# Altium footprint library ICs And Semiconductors SMD.PcbLib: 602 footprints (part 34 of 38)
Each footprint in its own frame and in the unit in brackets; x right, y up, seen from the top. Pads: shape width x height; smd on the part's side, far side on the other; paste and mask are expansions set on the pad; w line width, h text height; cw(c..) or ccw(c..) is an arc to the next point about the centre after c.
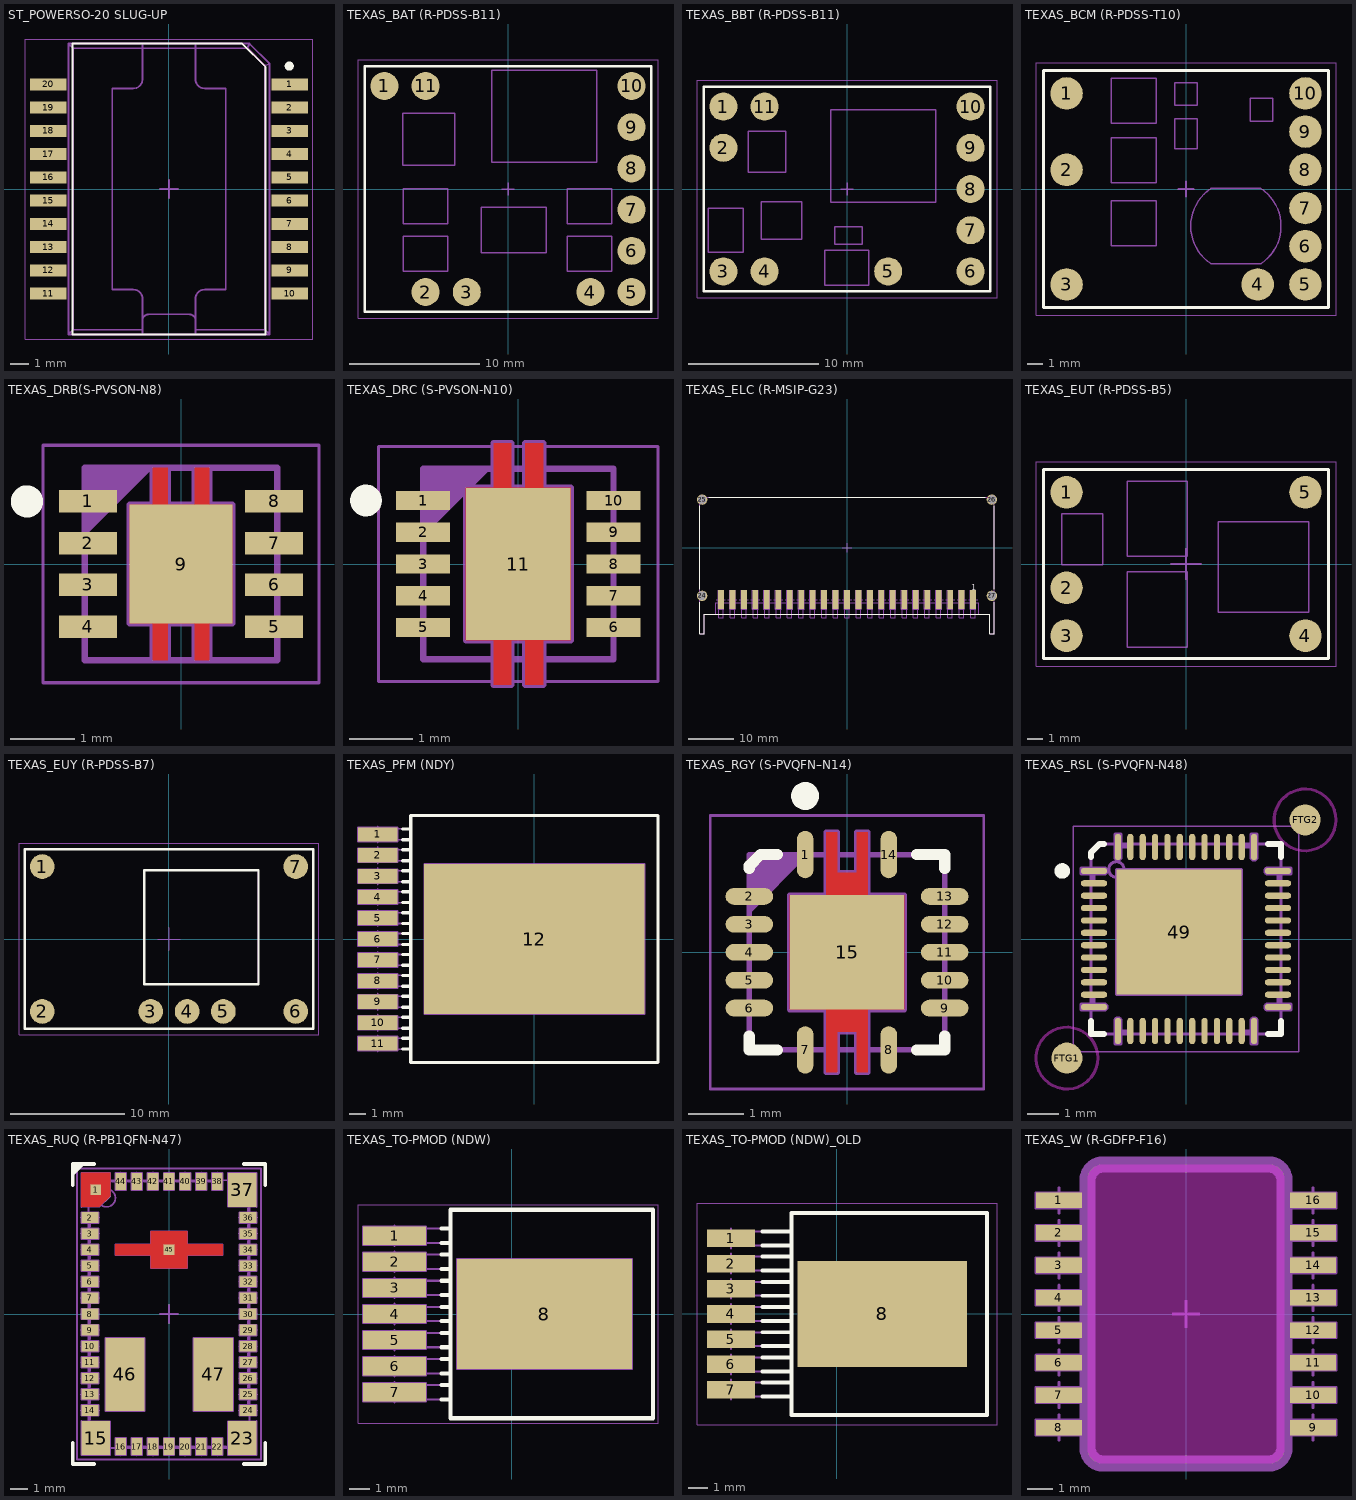
[diagram p33: the footprints below, top view; thin cyan lines are the x and y axes]

## ST_POWERSO-20 SLUG-UP [mm] "SOIC, 1.27mm Pitch; 20 Pin, 11.00mm W X 15.70mm L X 3.50mm H body (w/Thermal Tab on Top Side"
height 3.5
pads (20):
  rect 2x0.65 smd: 1(6.6,5.715) 2(6.6,4.445) 3(6.6,3.175) 4(6.6,1.905) 5(6.6,0.635) 6(6.6,-0.635) 7(6.6,-1.905) 8(6.6,-3.175) 9(6.6,-4.445) 10(6.6,-5.715) 11(-6.6,-5.715) 12(-6.6,-4.445) 13(-6.6,-3.175) 14(-6.6,-1.905) 15(-6.6,-0.635) 16(-6.6,0.635) 17(-6.6,1.905) 18(-6.6,3.175) 19(-6.6,4.445) 20(-6.6,5.715)
Top Overlay:
  circle w0.25: c6.575,6.72 r0.125
  lines w0.1: -5.275,-7.95 -5.275,7.95 4.003,7.95 5.275,6.678 5.275,-7.95 -5.275,-7.95
Mechanical 8:
  lines w0.1: -0.5,0 0,0 ; 0,-0.5 0,0 ; 0,0.5 0,0 ; 0.5,0 0,0
Mechanical 14:
  lines w0.1: -1.45,-7.95 -1.45,-6 ccw(c-1.95,-6) -1.95,-5.5 -3.1,-5.5 -3.1,5.5 -1.95,5.5 ccw(c-1.95,6) -1.45,6 -1.45,7.95 ; -1.45,-7.696 -5.246,-7.696 ; -1.45,-7.2 cw(c-1.1,-7.2) -1.1,-6.85 1.1,-6.85 cw(c1.1,-7.2) 1.45,-7.2 ; 1.45,-7.95 1.45,-6 cw(c1.95,-6) 1.95,-5.5 3.1,-5.5 3.1,5.5 1.95,5.5 cw(c1.95,6) 1.45,6 1.45,7.95 ; 1.45,-7.696 5.246,-7.696 ; -5.5,-7.95 -5.246,-7.696 ; -5.5,-7.95 5.5,-7.95 ; -5.5,-7.95 -5.5,7.95 ; -5.5,7.95 -5.246,7.696 ; -5.5,7.95 4.4,7.95 ; -5.246,-7.696 -5.246,7.696 ; -5.246,7.696 4.295,7.696 ; 4.295,7.696 5.246,6.745 ; 4.295,7.696 4.4,7.95 ; 4.4,7.95 5.5,6.85 ; 5.246,-7.696 5.5,-7.95 ; 5.246,-7.696 5.246,6.745 ; 5.246,6.745 5.5,6.85 ; 5.5,-7.95 5.5,6.85
Mechanical 15:
  lines w0.05: -7.85,-8.2 7.85,-8.2 7.85,8.2 -7.85,8.2 -7.85,-8.2
3D body "ST_POWERSO-20 SLUG-UP.stp": height 3.5, standoff 0, extent -7.1,-7.95 7.1,7.95

## TEXAS_BAT (R-PDSS-B11) [mm] "TEXAS BAT (R-PDSS-B11) Case"
height 8.5
pads (11):
  round 2.16 smd: 1(-9.525,7.938) 2(-6.35,-7.938) 3(-3.175,-7.938) 4(6.35,-7.938) 5(9.525,-7.938) 6(9.525,-4.763) 7(9.525,-1.587) 8(9.525,1.587) 9(9.525,4.763) 10(9.525,7.938) 11(-6.35,7.938)
Top Overlay:
  lines w0.2: -11.049,-9.462 11.049,-9.462 11.049,9.462 -11.049,9.462 -11.049,-9.462
Mechanical 8:
  lines w0.1: -10.025,7.938 -9.525,7.938 ; -9.525,7.438 -9.525,7.938 ; -9.525,8.438 -9.525,7.938 ; -9.025,7.938 -9.525,7.938 ; -6.85,-7.938 -6.35,-7.938 ; -6.85,7.938 -6.35,7.938 ; -6.35,-8.438 -6.35,-7.938 ; -6.35,-7.438 -6.35,-7.938 ; -6.35,7.438 -6.35,7.938 ; -6.35,8.438 -6.35,7.938 ; -5.85,-7.938 -6.35,-7.938 ; -5.85,7.938 -6.35,7.938 ; -3.675,-7.938 -3.175,-7.938 ; -3.175,-8.438 -3.175,-7.938 ; -3.175,-7.438 -3.175,-7.938 ; -2.675,-7.938 -3.175,-7.938 ; -0.5,0 0,0 ; 0,-0.5 0,0 ; 0,0.5 0,0 ; 0.5,0 0,0 ; 5.85,-7.938 6.35,-7.938 ; 6.35,-8.438 6.35,-7.938 ; 6.35,-7.438 6.35,-7.938 ; 6.85,-7.938 6.35,-7.938 ; 9.025,-7.938 9.525,-7.938 ; 9.025,-4.763 9.525,-4.763 ; 9.025,-1.587 9.525,-1.587 ; 9.025,1.587 9.525,1.587 ; 9.025,4.763 9.525,4.763 ; 9.025,7.938 9.525,7.938 ; 9.525,-8.438 9.525,-7.938 ; 9.525,-7.438 9.525,-7.938 ; 9.525,-5.263 9.525,-4.763 ; 9.525,-4.263 9.525,-4.763 ; 9.525,-2.088 9.525,-1.587 ; 9.525,-1.088 9.525,-1.587 ; 9.525,1.088 9.525,1.587 ; 9.525,2.088 9.525,1.587 ; 9.525,4.263 9.525,4.763 ; 9.525,5.263 9.525,4.763 ; 9.525,7.438 9.525,7.938 ; 9.525,8.438 9.525,7.938 ; 10.025,-7.938 9.525,-7.938 ; 10.025,-4.763 9.525,-4.763 ; 10.025,-1.587 9.525,-1.587 ; 10.025,1.587 9.525,1.587 ; 10.025,4.763 9.525,4.763 ; 10.025,7.938 9.525,7.938
Mechanical 14:
  lines w0.1: -11.049,-9.462 -11.049,9.462 11.049,9.462 11.049,-9.462 -11.049,-9.462 ; -8.122,1.829 -8.122,5.829 -4.122,5.829 -4.122,1.829 -8.122,1.829 ; -8.054,-6.337 -8.054,-3.637 -4.654,-3.637 -4.654,-6.337 -8.054,-6.337 ; -8.054,-2.671 -8.054,0.029 -4.654,0.029 -4.654,-2.671 -8.054,-2.671 ; -2.059,-4.897 2.941,-4.897 2.941,-1.397 -2.059,-1.397 -2.059,-4.897 ; -1.251,2.062 -1.251,9.162 6.849,9.162 6.849,2.062 -1.251,2.062 ; 4.584,-6.337 4.584,-3.637 7.984,-3.637 7.984,-6.337 4.584,-6.337 ; 4.584,-2.671 4.584,0.029 7.984,0.029 7.984,-2.671 4.584,-2.671
Mechanical 15:
  lines w0.05: -11.557,-9.97 -11.557,9.97 11.557,9.97 11.557,-9.97 -11.557,-9.97
3D body "TEXAS_BAT (R-PDSS-B11).stp": height 9.09, standoff 0, extent -11.049,-9.461 11.049,9.462

## TEXAS_BBT (R-PDSS-B11) [mm] "TEXAS BBT (R-PDSS-B11) Case"
height 8.5
pads (11):
  round 2.16 smd: 1(-9.525,6.35) 2(-9.525,3.175) 3(-9.525,-6.35) 4(-6.35,-6.35) 5(3.175,-6.35) 6(9.525,-6.35) 7(9.525,-3.175) 8(9.525,0) 9(9.525,3.175) 10(9.525,6.35) 11(-6.35,6.35)
Top Overlay:
  lines w0.2: -11.049,-7.874 11.049,-7.874 11.049,7.874 -11.049,7.874 -11.049,-7.874
Mechanical 8:
  lines w0.1: -10.025,-6.35 -9.525,-6.35 ; -10.025,3.175 -9.525,3.175 ; -10.025,6.35 -9.525,6.35 ; -9.525,-6.85 -9.525,-6.35 ; -9.525,-5.85 -9.525,-6.35 ; -9.525,2.675 -9.525,3.175 ; -9.525,3.675 -9.525,3.175 ; -9.525,5.85 -9.525,6.35 ; -9.525,6.85 -9.525,6.35 ; -9.025,-6.35 -9.525,-6.35 ; -9.025,3.175 -9.525,3.175 ; -9.025,6.35 -9.525,6.35 ; -6.85,-6.35 -6.35,-6.35 ; -6.85,6.35 -6.35,6.35 ; -6.35,-6.85 -6.35,-6.35 ; -6.35,-5.85 -6.35,-6.35 ; -6.35,5.85 -6.35,6.35 ; -6.35,6.85 -6.35,6.35 ; -5.85,-6.35 -6.35,-6.35 ; -5.85,6.35 -6.35,6.35 ; -0.5,0 0,0 ; 0,-0.5 0,0 ; 0,0.5 0,0 ; 0.5,0 0,0 ; 2.675,-6.35 3.175,-6.35 ; 3.175,-6.85 3.175,-6.35 ; 3.175,-5.85 3.175,-6.35 ; 3.675,-6.35 3.175,-6.35 ; 9.025,-3.175 9.525,-3.175 ; 9.025,0 9.525,0 ; 9.025,3.175 9.525,3.175 ; 9.025,6.35 9.525,6.35 ; 9.525,-3.675 9.525,-3.175 ; 9.525,-2.675 9.525,-3.175 ; 9.525,-0.5 9.525,0 ; 9.525,0.5 9.525,0 ; 9.525,2.675 9.525,3.175 ; 9.525,3.675 9.525,3.175 ; 9.525,5.85 9.525,6.35 ; 9.525,6.85 9.525,6.35 ; 10.025,-3.175 9.525,-3.175 ; 10.025,0 9.525,0 ; 10.025,3.175 9.525,3.175 ; 10.025,6.35 9.525,6.35 ; 9.525,-6.35 9.025,-6.35 9.525,-6.35 ; 9.525,-6.35 9.525,-6.85 9.525,-6.35 ; 9.525,-6.35 10.025,-6.35 9.525,-6.35 ; 9.525,-6.35 9.525,-5.85 9.525,-6.35
Mechanical 14:
  lines w0.1: -11.049,-7.874 -11.049,7.874 11.049,7.874 11.049,-7.874 -11.049,-7.874 ; -10.681,-4.876 -10.681,-1.476 -7.981,-1.476 -7.981,-4.876 -10.681,-4.876 ; -7.601,1.286 -7.601,4.436 -4.701,4.436 -4.701,1.286 -7.601,1.286 ; -6.625,-3.872 -6.625,-0.972 -3.475,-0.972 -3.475,-3.872 -6.625,-3.872 ; -1.721,-7.416 -1.721,-4.716 1.679,-4.716 1.679,-7.416 -1.721,-7.416 ; -1.251,-1.005 -1.251,6.095 6.849,6.095 6.849,-1.005 -1.251,-1.005 ; -0.929,-4.272 -0.929,-2.922 1.171,-2.922 1.171,-4.272 -0.929,-4.272
Mechanical 15:
  lines w0.05: -11.557,-8.382 -11.557,8.382 11.557,8.382 11.557,-8.382 -11.557,-8.382
3D body "TEXAS_BBT (R-PDSS-B11).stp": height 9.09, standoff 0, extent -11.049,-7.874 11.049,7.874

## TEXAS_BCM (R-PDSS-T10) [mm] "TEXAS BCM (R-PDSS-T10)  Case"
height 8.5
pads (10):
  round 2.16 smd: 1(-7.935,6.355) 2(-7.935,1.275) 3(-7.935,-6.345) 4(4.765,-6.345) 5(7.935,-6.345) 6(7.935,-3.805) 7(7.935,-1.265) 8(7.935,1.275) 9(7.935,3.815) 10(7.935,6.355)
Top Overlay:
  lines w0.2: -9.46,-7.875 -9.46,7.875 9.46,7.875 9.46,-7.875 -9.46,-7.875
Mechanical 8:
  lines w0.1: -8.435,-6.345 -7.935,-6.345 ; -8.435,1.275 -7.935,1.275 ; -8.435,6.355 -7.935,6.355 ; -7.935,-6.845 -7.935,-6.345 ; -7.935,-5.845 -7.935,-6.345 ; -7.935,0.775 -7.935,1.275 ; -7.935,1.775 -7.935,1.275 ; -7.935,5.855 -7.935,6.355 ; -7.935,6.855 -7.935,6.355 ; -7.435,-6.345 -7.935,-6.345 ; -7.435,1.275 -7.935,1.275 ; -7.435,6.355 -7.935,6.355 ; -0.5,0 0,0 ; 0,-0.5 0,0 ; 0,0.5 0,0 ; 0.5,0 0,0 ; 4.265,-6.345 4.765,-6.345 ; 4.765,-6.845 4.765,-6.345 ; 4.765,-5.845 4.765,-6.345 ; 5.265,-6.345 4.765,-6.345 ; 7.435,-6.345 7.935,-6.345 ; 7.435,-3.805 7.935,-3.805 ; 7.435,-1.265 7.935,-1.265 ; 7.435,1.275 7.935,1.275 ; 7.435,3.815 7.935,3.815 ; 7.435,6.355 7.935,6.355 ; 7.935,-6.845 7.935,-6.345 ; 7.935,-5.845 7.935,-6.345 ; 7.935,-4.305 7.935,-3.805 ; 7.935,-3.305 7.935,-3.805 ; 7.935,-1.765 7.935,-1.265 ; 7.935,-0.765 7.935,-1.265 ; 7.935,0.775 7.935,1.275 ; 7.935,1.775 7.935,1.275 ; 7.935,3.315 7.935,3.815 ; 7.935,4.315 7.935,3.815 ; 7.935,5.855 7.935,6.355 ; 7.935,6.855 7.935,6.355 ; 8.435,-6.345 7.935,-6.345 ; 8.435,-3.805 7.935,-3.805 ; 8.435,-1.265 7.935,-1.265 ; 8.435,1.275 7.935,1.275 ; 8.435,3.815 7.935,3.815 ; 8.435,6.355 7.935,6.355
Mechanical 14:
  lines w0.1: -9.46,-7.875 9.46,-7.875 9.46,7.875 -9.46,7.875 -9.46,-7.875 ; -4.963,-3.774 -1.963,-3.774 -1.963,-0.774 -4.963,-0.774 -4.963,-3.774 ; -4.963,0.422 -1.963,0.422 -1.963,3.422 -4.963,3.422 -4.963,0.422 ; -4.963,4.361 -1.963,4.361 -1.963,7.361 -4.963,7.361 -4.963,4.361 ; -0.75,2.683 0.75,2.683 0.75,4.683 -0.75,4.683 -0.75,2.683 ; -0.75,5.572 0.75,5.572 0.75,7.072 -0.75,7.072 -0.75,5.572 ; 1.656,-4.966 cw(c3.314,-2.466) 1.656,0.034 4.972,0.034 cw(c3.314,-2.466) 4.972,-4.966 1.656,-4.966 ; 4.255,4.516 5.755,4.516 5.755,6.016 4.255,6.016 4.255,4.516
Mechanical 15:
  lines w0.05: -9.97,-8.38 -9.97,8.38 9.97,8.38 9.97,-8.38 -9.97,-8.38
3D body "TEXAS_BCM (R-PDSS-T10).stp": height 8.5, standoff 0, extent -9.46,-7.875 9.46,7.875

## TEXAS_DRB(S-PVSON-N8) [mm] "TEXAS Case Style DRB(S-PVSON-N8), SON, 0.65mm pitch, 8 pin, 3mm X 3mm X 1.00mm H body (w/thermal tab 1.60 X 1.85mm)"
height 1
pads (9):
  rect 0.9x0.35 smd: 1(-1.45,0.975) 2(-1.45,0.325) 3(-1.45,-0.325) 4(-1.45,-0.975) 5(1.45,-0.975) 6(1.45,-0.325) 7(1.45,0.325) 8(1.45,0.975)
  rect 1.6x1.85 smd: 9(0,0)
Top Layer:
  region: -0.44,-1.5 -0.44,-0.925 -0.8,-0.925 -0.8,0.925 -0.44,0.925 -0.44,1.5 -0.21,1.5 -0.21,0.925 0.21,0.925 0.21,1.5 0.44,1.5 0.44,0.925 0.8,0.925 0.8,-0.925 0.44,-0.925 0.44,-1.5 0.21,-1.5 0.21,-0.925 -0.21,-0.925 -0.21,-1.5
Top Overlay:
  circle w0.25: c-2.4,0.975 r0.125
Mechanical 8:
  lines w0.1: -0.8,-0.925 -0.8,0.925 -0.44,0.925 -0.44,1.5 -0.21,1.5 -0.21,0.925 0.21,0.925 0.21,1.5 0.44,1.5 0.44,0.925 0.8,0.925 0.8,-0.925 0.44,-0.925 0.44,-1.5 0.21,-1.5 0.21,-0.925 -0.21,-0.925 -0.21,-1.5 -0.44,-1.5 -0.44,-0.925 -0.8,-0.925
Mechanical 14:
  lines w0.1: -1.5,0.5 -0.5,1.5 ; -1.5,0.6 -0.6,1.5 ; -1.5,0.7 -0.7,1.5 ; -1.5,0.8 -0.8,1.5 ; -1.5,0.9 -0.9,1.5 ; -1.5,1 -1,1.5 ; -1.5,1.1 -1.1,1.5 ; -1.5,1.2 -1.2,1.5 ; -1.5,1.3 -1.3,1.5 ; -1.5,1.4 -1.4,1.5 ; -1.5,-1.5 -1.5,1.5 1.5,1.5 1.5,-1.5 -1.5,-1.5
Mechanical 15:
  circle w0.05: c0,0 r0.35
  lines w0.05: -0.5,0 0.5,0 ; 0,-0.5 0,0.5 ; -2.15,-1.85 2.15,-1.85 2.15,1.85 -2.15,1.85 -2.15,-1.85
3D body "SON65P300X300X100-9N-R160X185.stp": height 1, standoff 0, extent -1.5,-1.5 1.5,1.5

## TEXAS_DRC (S-PVSON-N10) [mm] "SON, TEXAS DRC (S-PVSON-N10), 0.50mm Pitch, 10-pin, 3.00mm W  X 3.00mm L X 1.00mm Height, (w/thermal tab 1.65 X 2.40 mm)"
height 1
pads (11):
  rect 0.85x0.3 smd: 1(-1.5,1) 2(-1.5,0.5) 3(-1.5,0) 4(-1.5,-0.5) 5(-1.5,-1) 6(1.5,-1) 7(1.5,-0.5) 8(1.5,0) 9(1.5,0.5) 10(1.5,1)
  rect 1.65x2.4 smd: 11(0,0)
Top Layer:
  region: -0.825,1.2 -0.39,1.2 -0.39,1.9 -0.11,1.9 -0.11,1.2 0.11,1.2 0.11,1.9 0.39,1.9 0.39,1.2 0.825,1.2 0.825,-1.2 0.39,-1.2 0.39,-1.9 0.11,-1.9 0.11,-1.2 -0.11,-1.2 -0.11,-1.9 -0.39,-1.9 -0.39,-1.2 -0.825,-1.2
Top Overlay:
  circle w0.25: c-2.4,1 r0.125
Mechanical 8:
  lines w0.1: -0.5,0 0,0 ; 0,-0.5 0,0 ; 0,0.5 0,0 ; 0.5,0 0,0 ; -0.825,-1.2 -0.39,-1.2 -0.39,-1.9 -0.11,-1.9 -0.11,-1.2 0.11,-1.2 0.11,-1.9 0.39,-1.9 0.39,-1.2 0.825,-1.2 0.825,1.2 0.39,1.2 0.39,1.9 0.11,1.9 0.11,1.2 -0.11,1.2 -0.11,1.9 -0.39,1.9 -0.39,1.2 -0.825,1.2 -0.825,-1.2
Mechanical 14:
  lines w0.1: -1.5,0.5 -0.5,1.5 ; -1.5,0.6 -0.6,1.5 ; -1.5,0.7 -0.7,1.5 ; -1.5,0.8 -0.8,1.5 ; -1.5,0.9 -0.9,1.5 ; -1.5,1 -1,1.5 ; -1.5,1.1 -1.1,1.5 ; -1.5,1.2 -1.2,1.5 ; -1.5,1.3 -1.3,1.5 ; -1.5,1.4 -1.4,1.5 ; -1.5,-1.5 -1.5,1.5 1.5,1.5 1.5,-1.5 -1.5,-1.5
Mechanical 15:
  lines w0.05: -0.5,0 0.5,0 ; 0,-0.5 0,0.5 ; -2.2,-1.85 2.2,-1.85 2.2,1.85 -2.2,1.85 -2.2,-1.85
3D body "TEXAS_DRC (S-PVSON-N10).stp": height 1, standoff 0, extent -1.575,-1.575 1.575,1.575

## TEXAS_ELC (R-MSIP-G23) [mm] "TEXAS ELC (R-MSIP-G23) Case"
height 12.7
pads (27):
  rect 1.27x4.19 smd: 1(27.941,-11.509) 2(25.401,-11.509) 3(22.861,-11.509) 4(20.321,-11.509) 5(17.781,-11.509) 6(15.241,-11.509) 7(12.701,-11.509) 8(10.161,-11.509) 9(7.621,-11.509) 10(5.081,-11.509) 11(2.541,-11.509) 12(0.001,-11.509) 13(-2.539,-11.509) 14(-5.079,-11.509) 15(-7.619,-11.509) 16(-10.159,-11.509) 17(-12.699,-11.509) 18(-15.239,-11.509) 19(-17.779,-11.509) 20(-20.319,-11.509) 21(-22.859,-11.509) 22(-25.399,-11.509) 23(-27.939,-11.509)
  round 2.3 hole 1.8: 24(-32.105,-10.665) 25(-32.105,10.665) 26(32.105,10.665) 27(32.105,-10.665)
Top Overlay:
  lines w0.2: -32.605,-12.079 -32.605,-19.055 -31.605,-19.055 -31.605,-14.735 31.605,-14.735 31.605,-19.055 32.605,-19.055 32.605,-12.079 ; -32.605,-9.251 -32.605,9.251 ; -30.691,11.165 30.691,11.165 ; 32.605,-9.251 32.605,9.251
  text "1" at 27.559,-9.398 h1.27
Mechanical 8:
  drawing of 204 lines, arcs and shapes, not listed
Mechanical 14:
  lines w0.1: -29.105,-14.735 -29.105,-12.235 29.105,-12.235 29.105,-14.735 ; -28.44,-14.735 -31.605,-14.735 -31.605,-19.055 -32.605,-19.055 -32.605,11.165 32.605,11.165 32.605,-19.055 31.605,-19.055 31.605,-14.735 28.44,-14.735 ; -27.44,-14.735 -25.9,-14.735 ; -24.9,-14.735 -23.36,-14.735 ; -22.36,-14.735 -20.82,-14.735 ; -19.82,-14.735 -18.28,-14.735 ; -17.28,-14.735 -15.74,-14.735 ; -14.74,-14.735 -13.2,-14.735 ; -12.2,-14.735 -10.66,-14.735 ; -9.66,-14.735 -8.12,-14.735 ; -7.12,-14.735 -5.58,-14.735 ; -4.58,-14.735 -3.04,-14.735 ; -2.04,-14.735 -0.5,-14.735 ; 0.5,-14.735 2.04,-14.735 ; 3.04,-14.735 4.58,-14.735 ; 5.58,-14.735 7.12,-14.735 ; 8.12,-14.735 9.66,-14.735 ; 10.66,-14.735 12.2,-14.735 ; 13.2,-14.735 14.74,-14.735 ; 15.74,-14.735 17.28,-14.735 ; 18.28,-14.735 19.82,-14.735 ; 20.82,-14.735 22.36,-14.735 ; 23.36,-14.735 24.9,-14.735 ; 25.9,-14.735 27.44,-14.735 ; -28.44,-15.535 -28.44,-13.331 -27.44,-13.331 -27.44,-15.535 -28.44,-15.535 ; -25.9,-15.535 -25.9,-13.331 -24.9,-13.331 -24.9,-15.535 -25.9,-15.535 ; -23.36,-15.535 -23.36,-13.331 -22.36,-13.331 -22.36,-15.535 -23.36,-15.535 ; -20.82,-15.535 -20.82,-13.331 -19.82,-13.331 -19.82,-15.535 -20.82,-15.535 ; -18.28,-15.535 -18.28,-13.331 -17.28,-13.331 -17.28,-15.535 -18.28,-15.535 ; -15.74,-15.535 -15.74,-13.331 -14.74,-13.331 -14.74,-15.535 -15.74,-15.535 ; -13.2,-15.535 -13.2,-13.331 -12.2,-13.331 -12.2,-15.535 -13.2,-15.535 ; -10.66,-15.535 -10.66,-13.331 -9.66,-13.331 -9.66,-15.535 -10.66,-15.535 ; -8.12,-15.535 -8.12,-13.331 -7.12,-13.331 -7.12,-15.535 -8.12,-15.535 ; -5.58,-15.535 -5.58,-13.331 -4.58,-13.331 -4.58,-15.535 -5.58,-15.535 ; -3.04,-15.535 -3.04,-13.331 -2.04,-13.331 -2.04,-15.535 -3.04,-15.535 ; -0.5,-15.535 -0.5,-13.331 0.5,-13.331 0.5,-15.535 -0.5,-15.535 ; 2.04,-15.535 2.04,-13.331 3.04,-13.331 3.04,-15.535 2.04,-15.535 ; 4.58,-15.535 4.58,-13.331 5.58,-13.331 5.58,-15.535 4.58,-15.535 ; 7.12,-15.535 7.12,-13.331 8.12,-13.331 8.12,-15.535 7.12,-15.535 ; 9.66,-15.535 9.66,-13.331 10.66,-13.331 10.66,-15.535 9.66,-15.535 ; 12.2,-15.535 12.2,-13.331 13.2,-13.331 13.2,-15.535 12.2,-15.535 ; 14.74,-15.535 14.74,-13.331 15.74,-13.331 15.74,-15.535 14.74,-15.535 ; 17.28,-15.535 17.28,-13.331 18.28,-13.331 18.28,-15.535 17.28,-15.535 ; 19.82,-15.535 19.82,-13.331 20.82,-13.331 20.82,-15.535 19.82,-15.535 ; 22.36,-15.535 22.36,-13.331 23.36,-13.331 23.36,-15.535 22.36,-15.535 ; 24.9,-15.535 24.9,-13.331 25.9,-13.331 25.9,-15.535 24.9,-15.535 ; 27.44,-15.535 27.44,-13.331 28.44,-13.331 28.44,-15.535 27.44,-15.535
  text "1" at 27.559,-9.398 h1.27
3D body "TEXAS_ELC (R–MSIP–G23).stp": height 12.7, standoff -4, extent -32.605,-19.055 32.605,11.165

## TEXAS_EUT (R-PDSS-B5) [mm] "Texas EUT (R-PDSS-B5) Case"
height 8.5
pads (5):
  round 2.16 smd: 1(-7.94,4.765) 2(-7.94,-1.585) 3(-7.94,-4.765) 4(7.94,-4.765) 5(7.94,4.765)
Top Overlay:
  lines w0.2: -9.46,-6.285 -9.46,6.285 9.46,6.285 9.46,-6.285 -9.46,-6.285
Mechanical 8:
  lines w0.1: -8.94,-4.765 -7.94,-4.765 ; -8.94,-1.585 -7.94,-1.585 ; -8.94,4.765 -7.94,4.765 ; -7.94,-5.765 -7.94,-4.765 ; -7.94,-3.765 -7.94,-4.765 ; -7.94,-2.585 -7.94,-1.585 ; -7.94,-0.585 -7.94,-1.585 ; -7.94,3.765 -7.94,4.765 ; -7.94,5.765 -7.94,4.765 ; -6.94,-4.765 -7.94,-4.765 ; -6.94,-1.585 -7.94,-1.585 ; -6.94,4.765 -7.94,4.765 ; -1,0 0,0 ; 0,-1 0,0 ; 0,1 0,0 ; 1,0 0,0 ; 6.94,-4.765 7.94,-4.765 ; 6.94,4.765 7.94,4.765 ; 7.94,-5.765 7.94,-4.765 ; 7.94,-3.765 7.94,-4.765 ; 7.94,3.765 7.94,4.765 ; 7.94,5.765 7.94,4.765 ; 8.94,-4.765 7.94,-4.765 ; 8.94,4.765 7.94,4.765
Mechanical 14:
  lines w0.1: -9.46,-6.285 9.46,-6.285 9.46,6.285 -9.46,6.285 -9.46,-6.285 ; -8.247,-0.059 -5.547,-0.059 -5.547,3.341 -8.247,3.341 -8.247,-0.059 ; -3.912,-5.523 0.088,-5.523 0.088,-0.523 -3.912,-0.523 -3.912,-5.523 ; -3.912,0.502 0.088,0.502 0.088,5.502 -3.912,5.502 -3.912,0.502 ; 2.154,-3.194 8.154,-3.194 8.154,2.806 2.154,2.806 2.154,-3.194
Mechanical 15:
  lines w0.05: -9.97,-6.795 9.97,-6.795 9.97,6.795 -9.97,6.795 -9.97,-6.795
3D body "TEXAS_EUT (R-PDSS-B5).stp": height 8.5, standoff 0, extent -9.46,-6.285 9.46,6.285
